# Altium footprint library MyPcbLib.PcbLib: 88 footprints (part 3 of 6)
Each footprint in its own frame and in the unit in brackets; x right, y up, seen from the top. Pads: shape width x height; smd on the part's side, far side on the other; paste and mask are expansions set on the pad; w line width, h text height; cw(c..) or ccw(c..) is an arc to the next point about the centre after c.
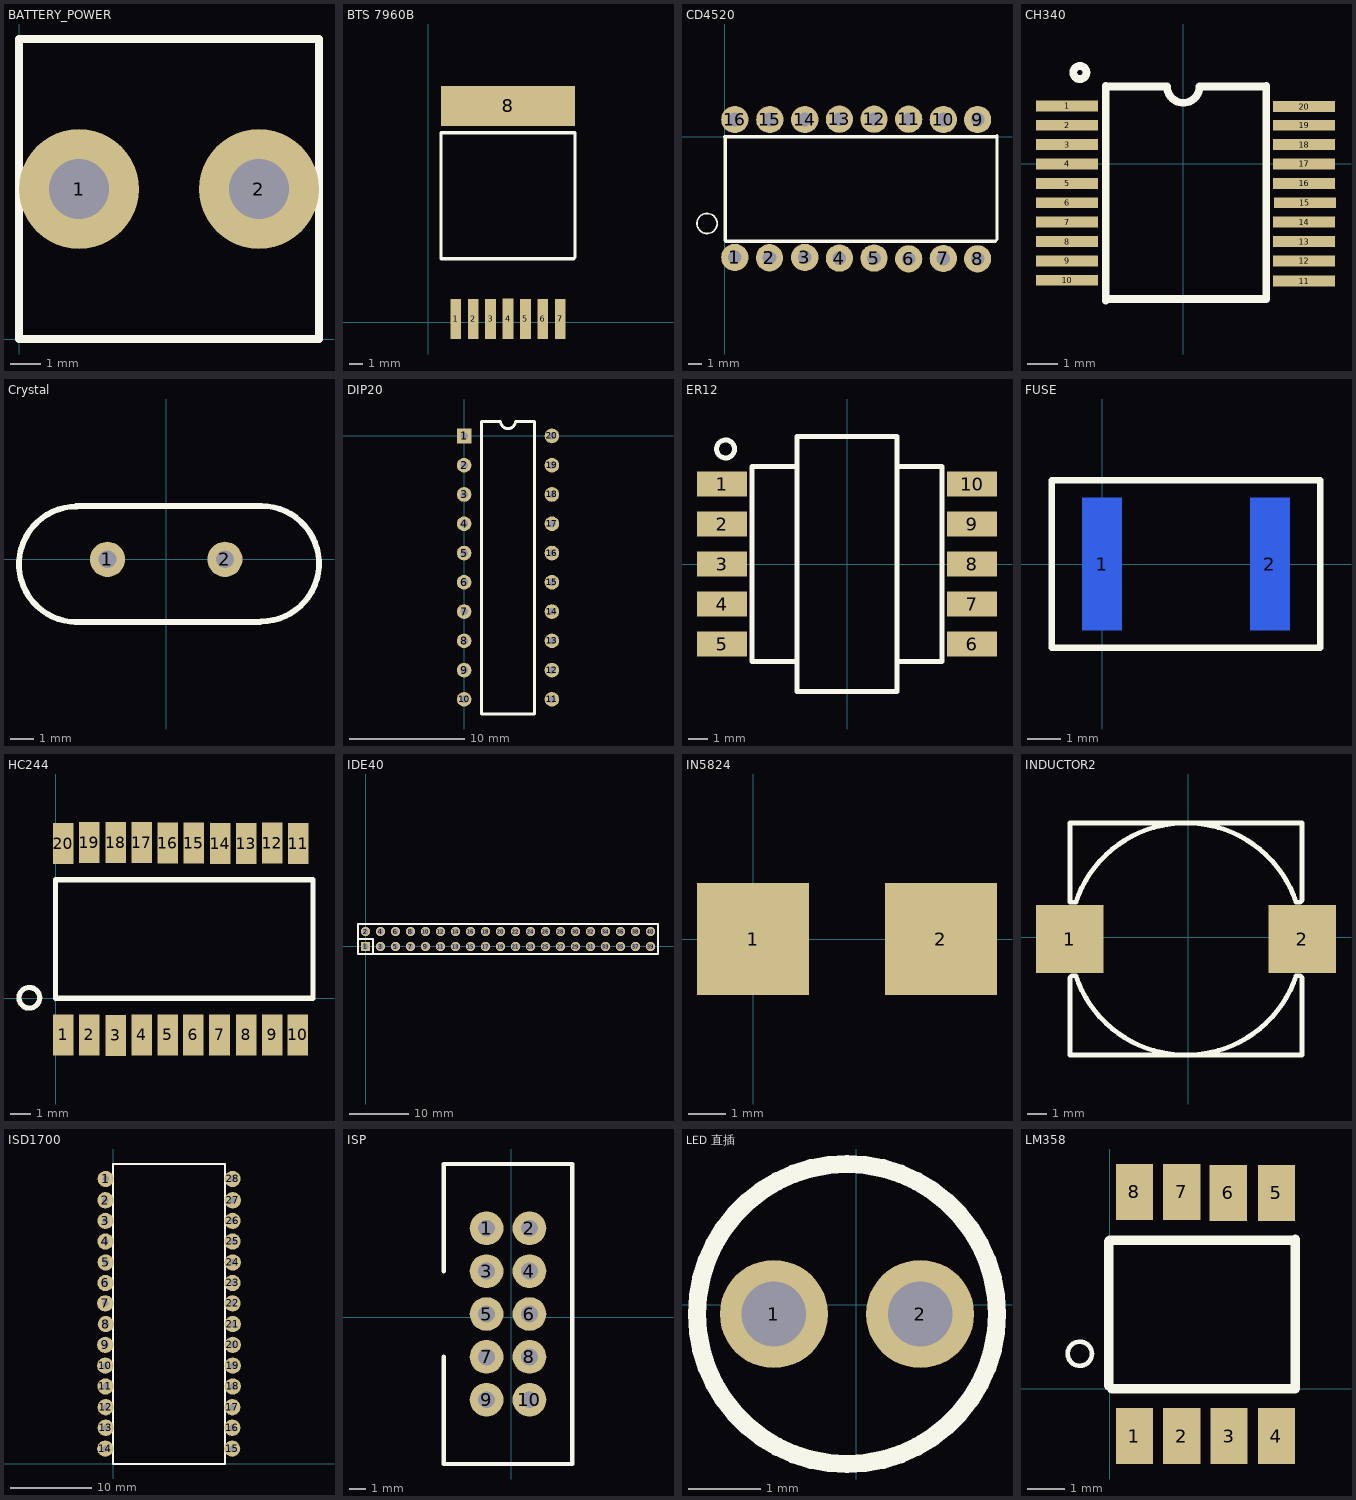
[diagram p2: the footprints below, top view; thin cyan lines are the x and y axes]

## BATTERY_POWER [mm]
pads (2):
  round 4 hole 2: 1(2,5) 2(8,5)
Top Overlay:
  lines w0.254: 0,0 10,0 10,10 0,10 0,0

## BTS 7960B [mm]
pads (8):
  rect 0.8x3 smd: 1(2.04,0.248) 2(3.34,0.248) 3(4.64,0.248) 4(5.944,0.254) 5(7.24,0.248) 6(8.54,0.248) 7(9.84,0.248)
  rect 10x3 smd: 8(5.94,16.148)
Top Overlay:
  lines w0.254: 10.84,4.748 0.94,4.748 0.94,14.148 10.94,14.148 10.94,4.848

## CD4520 [mm]
pads (16):
  round 2 hole 1: 1(0.737,-8.839) 2(3.277,-8.865) 3(5.867,-8.839) 4(8.407,-8.89) 5(10.947,-8.89) 6(13.487,-8.941) 7(16.027,-8.915) 8(18.542,-8.941) 9(18.542,1.27) 10(16.027,1.27) 11(13.487,1.295) 12(10.947,1.295) 13(8.407,1.295) 14(5.867,1.27) 15(3.302,1.27) 16(0.737,1.27)
Top Overlay:
  circle w0.127: c-1.297,-6.35 r0.738
  lines w0.254: 0,0.025 19.914,0.025 ; 0.025,-7.595 0.025,0.025 ; 0.076,-7.645 19.837,-7.645 ; 19.964,-7.518 19.964,0.076

## CH340 [mil]
pads (20):
  rect 80x14 smd: 1(-150,75) 2(-150,50) 3(-150,25) 4(-150,0) 5(-150,-25) 6(-150,-50) 7(-150,-75) 8(-150,-100) 9(-150,-125) 10(-150,-150) 11(156,-151) 12(156,-125) 13(156,-100) 14(156,-75) 15(157,-50) 16(156,-25) 17(156,0) 18(156,25) 19(156,50) 20(156,74)
Top Overlay:
  circle w10: c-133.49,118 r8.48
  lines w10: -100,-176 -100,101 ; -99,100 -21,100 ccw(c0,100) 21,100 107,100 ; -98,-174 107,-174 107,101

## Crystal [mil]
pads (2):
  round 60 hole 30: 1(-100,0) 2(100,0)
Top Overlay:
  lines w10: -155.24,-107 159.72,-107 ; -153.24,91 161.72,91 cw(c161.72,-7.42) 161.72,-105.85 ; -152.28,-106.85 cw(c-152.28,-8.43) -152.28,90

## DIP20 [mil]
pads (20):
  rect 50x50 hole 25: 1(0,0)
  round 50 hole 25: 2(0,-100) 3(0,-200) 4(0,-300) 5(0,-400) 6(0,-500) 7(0,-600) 8(0,-700) 9(0,-800) 10(0,-900) 11(300,-900) 12(300,-800) 13(300,-700) 14(300,-600) 15(300,-500) 16(300,-400) 17(300,-300) 18(300,-200) 19(300,-100) 20(300,0)
Top Overlay:
  lines w10: 60,-950 240,-950 240,50 175,50 cw(c150,50) 125,50 60,50 60,-950

## ER12 [mil]
height 153.54
pads (10):
  rect 100x50 smd: 1(-250,160) 2(-250,80) 3(-250,0) 4(-250,-80) 5(-250,-160) 6(250,-160) 7(250,-80) 8(250,0) 9(250,80) 10(250,160)
Top Overlay:
  circle w10: c-243.03,230 r18.03
  lines w10: -100,-195 -190,-195 -190,195 -100,195 ; 100,-195 190,-195 190,195 100,195 ; -100,-255 100,-255 100,255 -100,255 -100,-255

## FUSE [mm]
pads (2):
  rect 1.2x4 smd far side: 1(0,0) 2(5.08,0)
Top Overlay:
  lines w0.2: -1.524,-2.54 6.604,-2.54 6.604,2.54 -1.524,2.54 -1.524,-2.54

## HC244 [mil]
pads (20):
  rect 39.37x78.74 smd: 1(14,-70) 2(64,-70) 3(114,-71) 4(164,-70) 5(214,-70) 6(263,-70) 7(313,-70) 8(364,-70) 9(414,-70) 10(463,-70) 11(464,296) 12(414,297) 13(364,296) 14(314,296) 15(264,297) 16(214,297) 17(164,298) 18(114,298) 19(64,298) 20(14,296)
Top Overlay:
  circle w10: c-51,1 r19.8
  lines w10: -1,0 -1,227 492,227 492,0 0,0

## IDE40 [mil]
pads (40):
  rect 62x62 hole 40: 1(0,0)
  round 62 hole 40: 2(0,100) 3(100,0) 4(100,100) 5(200,0) 6(200,100) 7(300,0) 8(300,100) 9(400,0) 10(400,100) 11(500,0) 12(500,100) 13(600,0) 14(600,100) 15(700,0) 16(700,100) 17(800,0) 18(800,100) 19(900,0) 20(900,100) 21(1000,0) 22(1000,100) 23(1100,0) 24(1100,100) 25(1200,0) 26(1200,100) 27(1300,0) 28(1300,100) 29(1400,0) 30(1400,100) 31(1500,0) 32(1500,100) 33(1600,0) 34(1600,100) 35(1700,0) 36(1700,100) 37(1800,0) 38(1800,100) 39(1900,0) 40(1900,100)
Top Overlay:
  lines w12: -50,50 50,50 50,-50 ; -50,-50 1950,-50 1950,150 -50,150 -50,-50

## IN5824 [mm]
pads (2):
  rect 3x3 smd: 1(0,0) 2(5.029,0)

## INDUCTOR2 [mm]
pads (2):
  rect 3.5x3.5 smd: 1(-6.118,-0.08) 2(5.882,-0.08)
Top Overlay:
  lines w0.254: -5.813,1.82 -6.118,1.82 -6.118,5.92 5.882,5.92 5.882,1.92 5.779,1.817 5.574,1.817 ccw(c-0.118,-0.08) -5.81,1.817 ; -6.118,-6.08 -6.118,-2.08 -6.015,-1.977 -5.81,-1.977 ccw(c-0.118,-0.08) 5.574,-1.977 5.779,-1.977 5.882,-2.08 5.882,-6.08 -6.118,-6.08

## ISD1700 [mm]
pads (28):
  round 2 hole 0.8: 1(-0.925,35) 2(-0.95,32.375) 3(-0.95,29.85) 4(-0.95,27.325) 5(-0.925,24.75) 6(-0.95,22.225) 7(-0.975,19.725) 8(-0.9,17.175) 9(-0.975,14.625) 10(-0.975,12.075) 11(-0.95,9.525) 12(-0.925,6.975) 13(-0.925,4.45) 14(-0.97,1.885) 15(14.6,1.885) 16(14.625,4.45) 17(14.625,6.975) 18(14.675,9.525) 19(14.675,12.075) 20(14.675,14.625) 21(14.675,17.175) 22(14.65,19.725) 23(14.65,22.225) 24(14.675,24.75) 25(14.65,27.325) 26(14.65,29.85) 27(14.675,32.375) 28(14.65,35)
Top Layer:
  lines w0.254: 0,0.935 0.001,0.936
Top Overlay:
  lines w0.254: 0,0 13.72,0 13.72,36.83 0,36.83 0,0

## ISP [mm]
pads (10):
  round 2 hole 1: 1(-1.474,5.262) 2(1.066,5.262) 3(-1.474,2.722) 4(1.066,2.722) 5(-1.474,0.182) 6(1.066,0.182) 7(-1.474,-2.358) 8(1.066,-2.358) 9(-1.474,-4.898) 10(1.066,-4.898)
Top Overlay:
  lines w0.254: -4.014,-2.358 -4.014,-8.708 3.606,-8.708 3.606,9.072 -4.014,9.072 -4.014,2.722

## LED 直插 [mm]
pads (2):
  round 1.5 hole 0.9: 1(-1.143,-0.127) 2(0.889,-0.127)
Top Overlay:
  circle w0.254: c-0.127,-0.127 r2.083

## LM358 [mm]
pads (8):
  rect 1x1.5 smd: 1(0.66,-1.27) 2(1.93,-1.27) 3(3.2,-1.27) 4(4.47,-1.27) 5(4.47,5.258) 6(3.175,5.258) 7(1.93,5.283) 8(0.66,5.283)
Top Overlay:
  circle w0.127: c-0.808,0.94 r0.325
  lines w0.254: -0.025,0.076 -0.025,3.962 ; 0,3.988 4.953,3.988 ; 0.051,0 4.978,0 4.978,4.013